# Altium footprint library PBL - THD Packages.PcbLib: 137 footprints (part 5 of 9)
Each footprint in its own frame and in the unit in brackets; x right, y up, seen from the top. Pads: shape width x height; smd on the part's side, far side on the other; paste and mask are expansions set on the pad; w line width, h text height; cw(c..) or ccw(c..) is an arc to the next point about the centre after c.
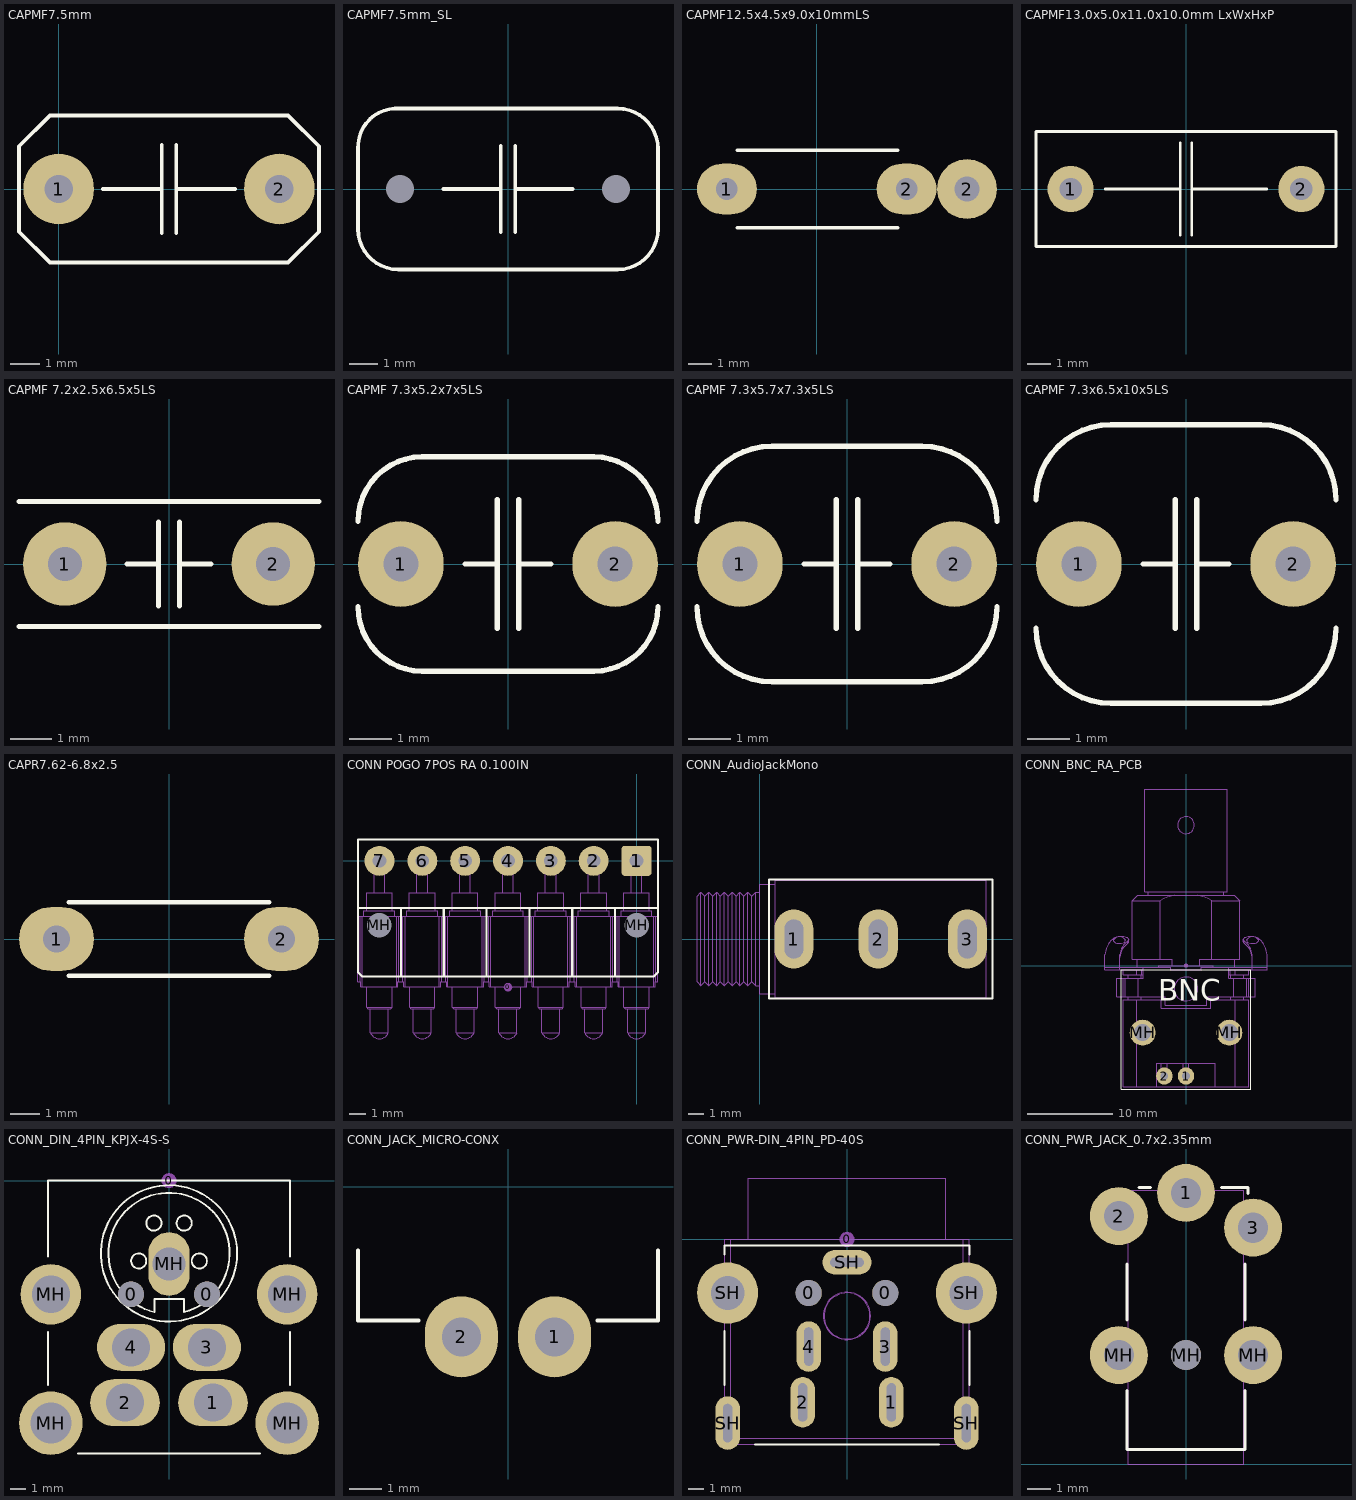
[diagram p4: the footprints below, top view; thin cyan lines are the x and y axes]

## CAPMF7.5mm [mm] "Capacitor, THT, Metallized Polyester Film"
height 10
pads (2):
  round 2.4 hole 0.965: 1(0,0) 2(7.5,0)
Top Overlay:
  lines w0.127: 1.5,0 3.5,0 ; 3.5,-1.5 3.5,1.5 ; 4,-1.5 4,1.5 ; 4,0 6,0 ; -1.35,-1.45 -0.3,-2.5 7.8,-2.5 8.85,-1.45 8.85,1.45 7.8,2.5 -0.3,2.5 -1.35,1.45 -1.35,-1.45
3D body: height 10, standoff 0.5, extent -1.359,-2.509 8.859,2.509

## CAPMF7.5mm_SL [mil] "Capacitor, THT, Metallized Polyester Film"
height 354.33
pads (2):
  round 0 / inner round 0 / far side round 94.49 hole 38 unplated: 1(-147.64,0) 2(147.64,0)
Top Overlay:
  lines w5: -88.58,0 -9.84,0 ; -9.84,-59.06 -9.84,59.06 ; 9.84,-59.06 9.84,59.06 ; 9.84,0 88.58,0 ; -205,-55 ccw(c-150,-55) -150,-110 150,-110 ccw(c150,-55) 205,-55 205,55 ccw(c150,55) 150,110 -155,110 ccw(c-152.5,57.5) -205,55 -205,-55
3D body: height 354.33, standoff -100, extent -196.85,-108.26 196.85,108.27

## CAPMF12.5x4.5x9.0x10mmLS [mil] "Capacitor, MF, Thru-Hole, Dipped Radial; Body 12.5 x 4.5 x 9.0 mm (WxTxH) Pin Spacing 10.0 mm (typ)"
height 354.33
pads (3):
  oval 100x85 hole 36: 1(-150,0) 2(150,0)
  round 100 hole 42: 2(251,0)
Top Overlay:
  lines w6: -132.72,-65 135,-65 ; -132.72,65 135,65
3D body: height 354.33, standoff -100, extent -196.06,-88.58 296.07,88.59

## CAPMF13.0x5.0x11.0x10.0mm LxWxHxP [mm] "Capacitor, THT, Metallized Polypropylene Film, 10mm lead pitch"
height 11
pads (2):
  round 2 hole 0.965: 1(-5,0) 2(5,0)
Top Overlay:
  lines w0.127: -3.5,0 -0.25,0 ; -0.25,-2 -0.25,2 ; 0.25,-2 0.25,2 ; 0.25,0 3.5,0 ; -6.5,-2.5 -6.5,2.5 6.5,2.5 6.5,-2.5 -6.5,-2.5
3D body: height 11, standoff 0, extent -6.5,-2.5 6.5,2.5

## CAPMF 7.2x2.5x6.5x5LS [mm] "Capacitor, THT, Metallized Polyester Film"
height 8.2
pads (2):
  round 2 hole 0.813: 1(-2.5,0) 2(2.5,0)
Top Overlay:
  lines w0.127: -3.6,-1.5 3.6,-1.5 ; -3.6,1.5 3.6,1.5 ; -1,0 -0.25,0 ; -0.25,-1 -0.25,1 ; 0.25,-1 0.25,1 ; 0.25,0 1,0
3D body: height 7.5, standoff -2, extent -3.6,-1.25 3.6,1.25

## CAPMF 7.3x5.2x7x5LS [mm] "Capacitor, THT, Metallized Polyester Film"
height 7
pads (2):
  round 2 hole 0.813: 1(-2.5,0) 2(2.5,0)
Top Overlay:
  lines w0.127: -3.5,-1 ccw(c-2,-1) -2,-2.5 2,-2.5 ccw(c2,-1) 3.5,-1 ; -3.5,1 cw(c-2,1) -2,2.5 2,2.5 cw(c2,1) 3.5,1 ; -1,0 -0.25,0 ; -0.25,-1.5 -0.25,1.5 ; 0.25,-1.5 0.25,1.5 ; 0.25,0 1,0
3D body: height 8, standoff -2, extent -3.65,-2.6 3.65,2.6

## CAPMF 7.3x5.7x7.3x5LS [mm] "Capacitor, THT, Metallized Polyester Film"
height 7
pads (2):
  round 2 hole 0.813: 1(-2.5,0) 2(2.5,0)
Top Overlay:
  lines w0.127: -3.5,-1 ccw(c-1.75,-1) -1.75,-2.75 1.75,-2.75 ccw(c1.75,-1) 3.5,-1 ; -3.5,1 cw(c-1.75,1) -1.75,2.75 1.75,2.75 cw(c1.75,1) 3.5,1 ; -1,0 -0.25,0 ; -0.25,-1.5 -0.25,1.5 ; 0.25,-1.5 0.25,1.5 ; 0.25,0 1,0
3D body: height 8.3, standoff -2, extent -3.65,-2.85 3.65,2.85

## CAPMF 7.3x6.5x10x5LS [mm] "Capacitor, THT, Metallized Polyester Film"
height 10
pads (2):
  round 2 hole 0.813: 1(-2.5,0) 2(2.5,0)
Top Overlay:
  lines w0.127: -3.5,-1.5 ccw(c-1.75,-1.5) -1.75,-3.25 1.75,-3.25 ccw(c1.75,-1.5) 3.5,-1.5 ; -3.5,1.5 cw(c-1.75,1.5) -1.75,3.25 1.75,3.25 cw(c1.75,1.5) 3.5,1.5 ; -1,0 -0.25,0 ; -0.25,-1.5 -0.25,1.5 ; 0.25,-1.5 0.25,1.5 ; 0.25,0 1,0
3D body: height 11, standoff -2, extent -3.65,-3.25 3.65,3.25

## CAPR7.62-6.8x2.5 [mil] "Capacitor, MF, Thru-Hole, Dipped Radial; Body 6.8 x 2.5 mm (WxT) Pin Spacing 7.62 mm (typ)"
height 236.22
pads (2):
  oval 100x85 hole 36 unplated: 1(-150,0) 2(150,0)
Top Overlay:
  lines w6: -133.86,-49.21 133.86,-49.21 ; -133.86,49.21 133.86,49.21
3D body: height 511.81, standoff -100, extent -202.75,-118.1 202.76,118.12

## CONN POGO 7POS RA 0.100IN [mil] "Connector; Pogo pins; 7 Position"
pads (10):
  round 20 on Mech14: 0(-300,-295)
  rrect20% 70x70 hole 32: 1(0,0)
  round 70 hole 32: 2(-100,0) 3(-200,0) 4(-300,0) 5(-400,0) 6(-500,0) 7(-600,0)
  round 55 hole 57 unplated: MH(-600,-150) MH(0,-150)
Top Overlay:
  lines w5: -650,-110 50,-110 ; -550,-270 -550,-110 ; -450,-270 -450,-110 ; -350,-270 -350,-110 ; -250,-270 -250,-110 ; -150,-270 -150,-110 ; -50,-270 -50,-110 ; -650,-260 -640,-270 40,-270 50,-260 50,50 -650,50 -650,-260
13 - 3D:
  drawing of 200 lines, arcs and shapes, not listed
3D body: height 100, standoff -127, extent -649.99,-414.99 50.01,12.51

## CONN_AudioJackMono [mm] "CUI MJ-3502 3.5mm audio jack - mono"
height 11.3
pads (3):
  oval 2.5x3.8 hole 1.2 slot 2.5 at 90 deg: 1(2.2,0) 2(7.6,0) 3(13.3,0)
Top Overlay:
  lines w0.127: 0.6,-3.8 0.6,3.8 14.9,3.8 14.9,-3.8 0.6,-3.8
13 - 3D:
  lines w0.05: 0,-3 -0.25,-3 ; 0,3 -0.25,3 ; 1,-3.5 0,-3.5 0,3.5 1,3.5 ; -3.75,-3 -4,-2.75 -4,2.75 -3.75,3 ; -3.75,-3 -3.5,-2.75 ; -3.75,-3 -3.75,3 ; -3.75,3 -3.5,2.75 ; -3.5,-2.75 -3.25,-3 ; -3.5,-2.75 -3.5,2.75 ; -3.5,2.75 -3.25,3 ; -3.25,-3 -3,-2.75 ; -3.25,-3 -3.25,3 ; -3.25,3 -3,2.75 ; -3,-2.75 -2.75,-3 ; -3,-2.75 -3,2.75 ; -3,2.75 -2.75,3 ; -2.75,-3 -2.5,-2.75 ; -2.75,-3 -2.75,3 ; -2.75,3 -2.5,2.75 ; -2.5,-2.75 -2.25,-3 ; -2.5,-2.75 -2.5,2.75 ; -2.5,2.75 -2.25,3 ; -2.25,-3 -2,-2.75 ; -2.25,-3 -2.25,3 ; -2.25,3 -2,2.75 ; -2,-2.75 -1.75,-3 ; -2,-2.75 -2,2.75 ; -2,2.75 -1.75,3 ; -1.75,-3 -1.5,-2.75 ; -1.75,-3 -1.75,3 ; -1.75,3 -1.5,2.75 ; -1.5,-2.75 -1.25,-3 ; -1.5,-2.75 -1.5,2.75 ; -1.5,2.75 -1.25,3 ; -1.25,-3 -1,-2.75 ; -1.25,-3 -1.25,3 ; -1.25,3 -1,2.75 ; -1,-2.75 -0.75,-3 ; -1,-2.75 -1,2.75 ; -1,2.75 -0.75,3 ; -0.75,-3 -0.5,-2.75 ; -0.75,-3 -0.75,3 ; -0.75,3 -0.5,2.75 ; -0.5,-2.75 -0.25,-3 ; -0.5,-2.75 -0.5,2.75 ; -0.5,2.75 -0.25,3 ; -0.25,-3 -0.25,3 ; 1,-3.75 14.5,-3.75 14.5,3.75 1,3.75 1,-3.75
3D body: height 11.3, standoff -4.1, extent -4,-3.75 14.5,3.75

## CONN_BNC_RA_PCB [mil] "BNC connector, right angle PCB-mounted"
height 530
pads (5):
  round 20 on Mech14: 0(0,0)
  oval 75x80 hole 35: 1(0,-510) 2(-100,-510)
  round 120 hole 79: MH(-200,-310) MH(200,-310)
Top Overlay:
  lines w5: -300,-570 300,-570 300,-20 -300,-20 -300,-570
  text "BNC" at -127.35,-163 h100
13 - 3D:
  drawing of 173 lines, arcs and shapes, not listed
3D body: height 532, standoff -135, extent -375,-559.78 375,815.22

## CONN_DIN_4PIN_KPJX-4S-S [mm] "Power Connector, 4-pin DIN"
height 15
pads (12):
  round 1.7 hole 1.7 unplated: 0(-2.5,-7.5) 0(2.5,-7.5)
  round 1 on Mech14: 0(0,0)
  oval 4.6x3.1 hole 2.5: 1(2.9,-14.65) 2(-2.9,-14.65)
  oval 4.5x3.1 hole 2.5: 3(2.5,-11) 4(-2.5,-11)
  round 4.2 hole 2.7: MH(-7.8,-16) MH(7.8,-16)
  round 4 hole 2.5: MH(-7.8,-7.5) MH(7.8,-7.5)
  oval 2.7x4.2 hole 2.2: MH(0,-5.5)
Top Overlay:
  circle w0.127: c2,-5.3 r0.5
  circle w0.127: c-2,-5.3 r0.5
  circle w0.127: c-1,-2.8 r0.5
  circle w0.127: c1,-2.8 r0.5
  circle w0.127: c0,-4.8 r4.5
  lines w0.127: -8,-13.5 -8,-10 ; -8,-5 -8,0 8,0 8,-5 ; -6,-18 6,-18 ; 1,-8.671 1,-7.8 -0.97,-7.8 -0.97,-8.681 cw(c0,-4.8) 1.007,-8.671 ; 8,-13.5 8,-10
3D body: height 15.01, standoff -3.49, extent -8,-17.65 8,0

## CONN_JACK_MICRO-CONX [mil] "Micro-ConX 17292-2PG-300"
height 480
pads (2):
  oval 90x100 hole 48: 1(57.5,-185) 2(-57.5,-185)
Top Overlay:
  lines w5: -185,-78.74 -185,-165 -110.24,-165 ; 110.24,-165 185,-165 185,-78.74
3D body: height 476.88, standoff -146.88, extent -312.51,-205 310.03,547.5

## CONN_PWR-DIN_4PIN_PD-40S [mm] "Power Connector, 4-pin DIN"
height 15
pads (12):
  round 1.7 hole 1.7 unplated: 0(-2.5,-3.5) 0(2.5,-3.5)
  round 1 on Mech14: 0(0,0)
  oval 1.6x3.3 hole 0.6 slot 2.5 at 90 deg: 1(2.9,-10.65) 2(-2.9,-10.65) 3(2.5,-7) 4(-2.5,-7)
  oval 1.6x3.5 hole 0.6 slot 2.5 at 90 deg: SH(-7.8,-12) SH(7.8,-12)
  round 4 hole 2.2: SH(-7.8,-3.5) SH(7.8,-3.5)
  oval 3.2x1.6 hole 0.6 slot 2.2 at 0 deg: SH(0,-1.5)
Top Overlay:
  lines w0.127: -8,-9.5 -8,-6 ; -8,-1 -8,-0.4 8,-0.4 8,-1 ; -6,-13.4 6,-13.4 ; 8,-9.5 8,-6
13 - 3D:
  circle w0.05: c0,-5 r1.55
  circle w0.05: c0,-5 r1.5
  lines w0.05: -7.6,0 -7.6,-13.4 ; -6.45,0 -6.45,4 6.45,4 6.45,0 ; 7.6,0 7.6,-13.4 ; -8,-13 ccw(c-7.6,-13) -7.6,-13.4 ; -8,-13 8,-13 ; -8,-13 -8,0 8,0 8,-13 ; -7.6,-13.4 7.6,-13.4 ; 7.6,-13.4 ccw(c7.6,-13) 8,-13
3D body: height 15, standoff -3.5, extent -8,-13.4 8,4

## CONN_PWR_JACK_0.7x2.35mm [mm] "Power Connector, 0.7mm ID, 2.35mm OD"
height 5
pads (6):
  round 2.5 hole 1.3: 1(0,11.7) 2(-2.9,10.7) 3(2.9,10.2) MH(-2.9,4.7) MH(2.9,4.7)
  round 1.3 hole 1.3 unplated: MH(0,4.7)
Top Overlay:
  lines w0.127: -2.54,3.175 -2.54,0.635 2.54,0.635 2.54,3.175 ; -2.54,6.223 -2.54,8.636 ; -2.032,11.938 -1.524,11.938 ; 1.524,11.938 2.667,11.938 2.667,11.684 ; 2.54,6.223 2.54,8.636
13 - 3D:
  lines w0.05: -2.819,4.204 -2.819,5.194 ; -2.819,10.198 -2.819,11.189 ; -2.502,4.204 -3.073,4.204 -3.073,5.194 -2.502,5.194 ; -2.502,10.198 -3.073,10.198 -3.073,11.189 -2.502,11.189 ; -0.495,11.811 -0.495,11.938 0.495,11.938 0.495,11.811 ; 2.502,4.204 3.073,4.204 3.073,5.194 2.502,5.194 ; 2.502,9.716 3.073,9.716 3.073,10.706 2.502,10.706 ; 2.819,4.204 2.819,5.194 ; 2.819,9.716 2.819,10.706 ; -2.502,0 -2.502,11.811 2.502,11.811 2.502,0 -2.502,0
3D body: height 5, standoff -2.5, extent -3.309,0 3.309,12.054